# Altium footprint library Footprints.PcbLib: 29 footprints (part 2 of 2)
Each footprint in its own frame and in the unit in brackets; x right, y up, seen from the top. Pads: shape width x height; smd on the part's side, far side on the other; paste and mask are expansions set on the pad; w line width, h text height; cw(c..) or ccw(c..) is an arc to the next point about the centre after c.
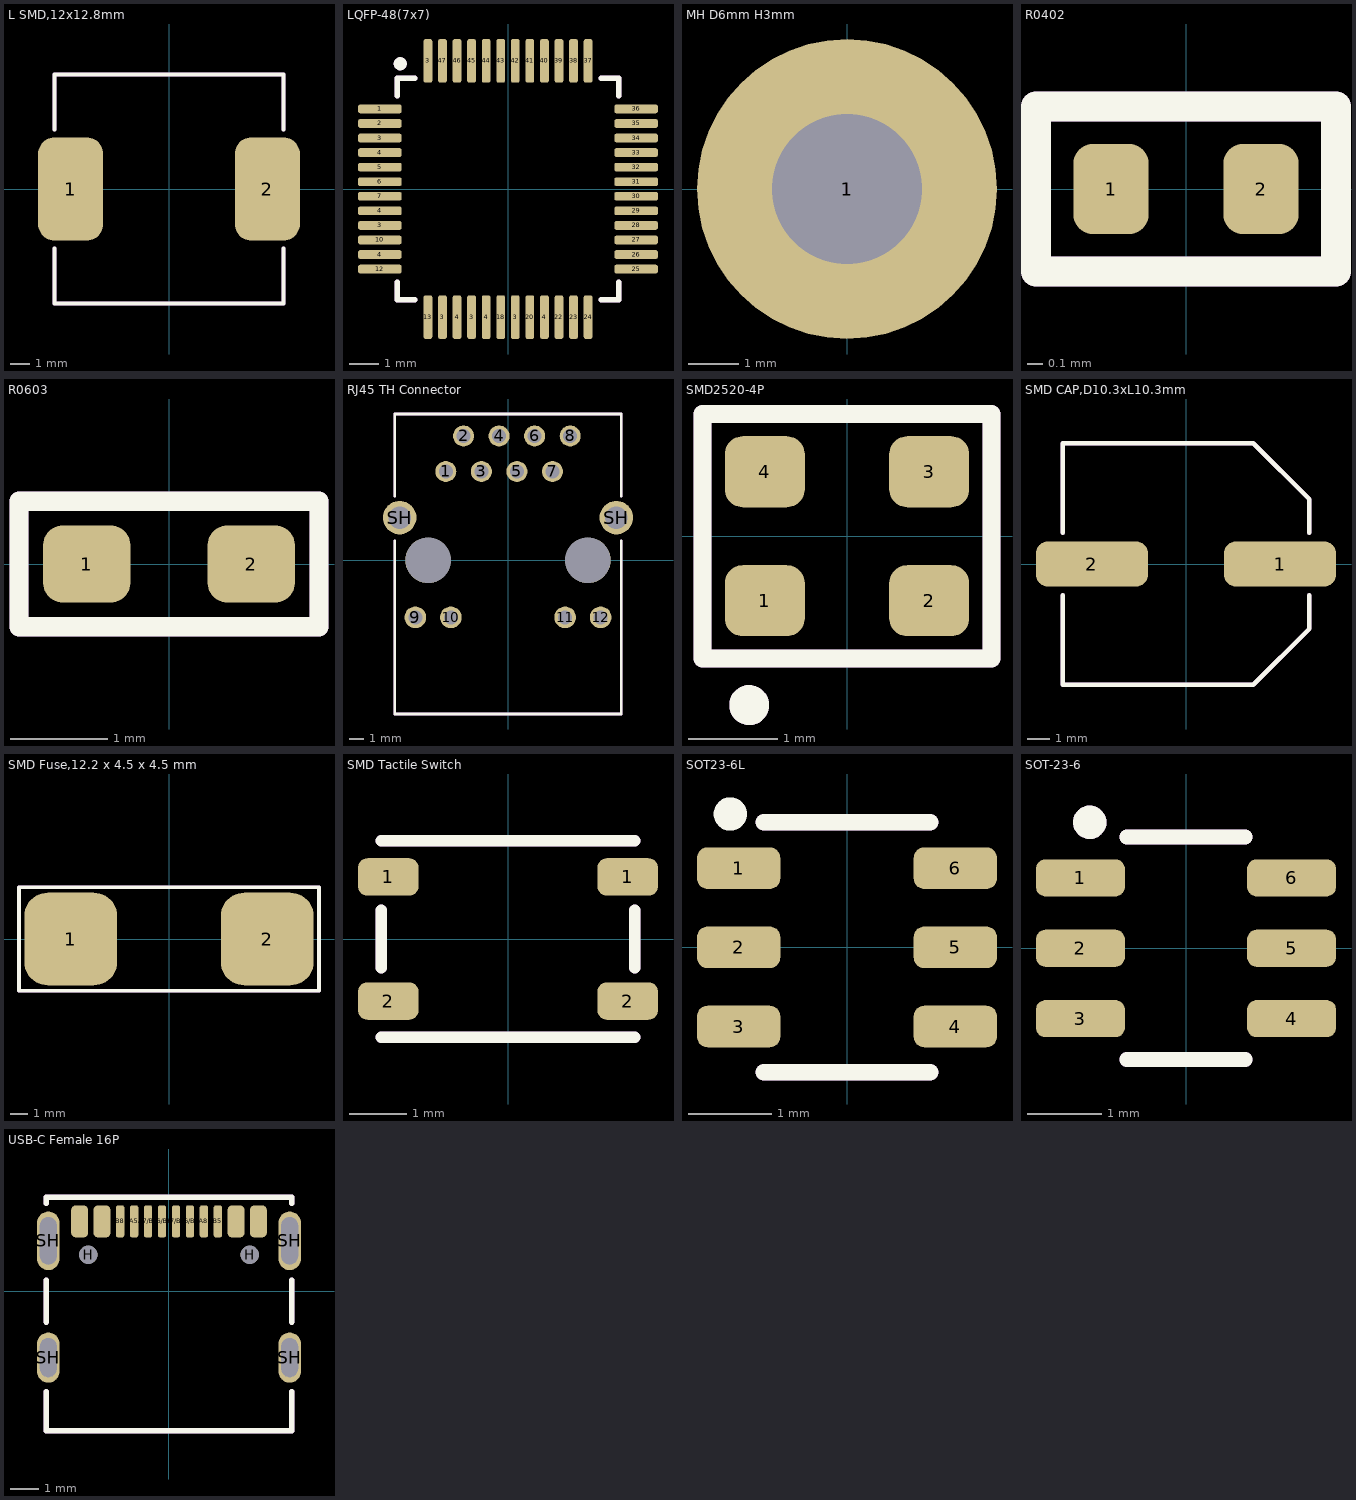
[diagram p1: the footprints below, top view; thin cyan lines are the x and y axes]

## L SMD,12x12.8mm [mm]
pads (2):
  rrect50% 3.4x5.4 smd: 1(-5.15,0) 2(5.15,0)
Top Overlay:
  lines w0.2: -6,-3.1 -6,-6 6,-6 6,-3.1 ; -6,3.1 -6,6 6,6 6,3.1
Top Assembly:
  lines w0.2: -6,-3.1 -6,-6 6,-6 6,-3.1 ; -6,3.1 -6,6 6,6 6,3.1
  text ".Designator" at -4.998,-0.333 h1
3D body "L SMD,12x12.8mm.stp": height 9.47, standoff 0.01, extent -6,-6 6,6

## LQFP-48(7x7) [mm]
pads (48):
  rrect50% 1.5x0.3 smd: 1(-4.4,2.75) 2(-4.4,2.25) 3(-4.4,-1.25) 3(-4.4,1.75) 4(-4.4,-2.25) 4(-4.4,-0.75) 4(-4.4,1.25) 5(-4.4,0.75) 6(-4.4,0.25) 7(-4.4,-0.25) 10(-4.4,-1.75) 12(-4.4,-2.75) 25(4.4,-2.75) 26(4.4,-2.25) 27(4.4,-1.75) 28(4.4,-1.25) 29(4.4,-0.75) 30(4.4,-0.25) 31(4.4,0.25) 32(4.4,0.75) 33(4.4,1.25) 34(4.4,1.75) 35(4.4,2.25) 36(4.4,2.75)
  rrect50% 0.3x1.5 smd: 3(-2.75,4.4) 3(-2.25,-4.4) 3(-1.25,-4.4) 3(0.25,-4.4) 4(-1.75,-4.4) 4(-0.75,-4.4) 4(1.25,-4.4) 13(-2.75,-4.4) 18(-0.25,-4.4) 20(0.75,-4.4) 22(1.75,-4.4) 23(2.25,-4.4) 24(2.75,-4.4) 37(2.75,4.4) 38(2.25,4.4) 39(1.75,4.4) 40(1.25,4.4) 41(0.75,4.4) 42(0.25,4.4) 43(-0.25,4.4) 44(-0.75,4.4) 45(-1.25,4.4) 46(-1.75,4.4) 47(-2.25,4.4)
Top Overlay:
  circle w0.25: c-3.7,4.3 r0.1
  lines w0.2: -3.8,-3.2 -3.8,-3.8 -3.2,-3.8 ; -3.8,3.2 -3.8,3.8 -3.2,3.8 ; 3.2,-3.8 3.8,-3.8 3.8,-3.2 ; 3.2,3.8 3.8,3.8 3.8,3.2
Top Assembly:
  circle w0.25: c-3.7,4.3 r0.1
  lines w0.2: -3.8,-3.2 -3.8,-3.8 -3.2,-3.8 ; -3.8,3.2 -3.8,3.8 -3.2,3.8 ; 3.2,-3.8 3.8,-3.8 3.8,-3.2 ; 3.2,3.8 3.8,3.8 3.8,3.2
  text ".Designator" at -4.998,-0.333 h1
3D body "LQFP-48(7x7).step": height 1.6, standoff 0, extent -4.597,-4.597 4.597,4.597

## MH D6mm H3mm [mm]
pads (1):
  round 6 hole 3: 1(0,0)

## R0402 [mm]
pads (2):
  rrect50% 0.5x0.6 smd: 1(-0.5,0) 2(0.5,0)
Top Overlay:
  lines w0.2: -1,-0.55 -1,0.55 1,0.55 1,-0.55 -1,-0.55
Top Assembly:
  lines w0.2: -1,-0.55 -1,0.55 1,0.55 1,-0.55 -1,-0.55
  text ".Designator" at -3.999,-0.267 h0.8
3D body "R0402.step": height 0.4, standoff 0, extent -0.5,-0.25 0.5,0.25

## R0603 [mm]
pads (2):
  rrect50% 0.9x0.8 smd: 1(-0.85,0) 2(0.85,0)
Top Overlay:
  lines w0.2: -1.55,-0.65 -1.55,0.65 1.55,0.65 1.55,-0.65 -1.55,-0.65
Top Assembly:
  lines w0.2: -1.55,-0.65 -1.55,0.65 1.55,0.65 1.55,-0.65 -1.55,-0.65
  text ".Designator" at -2.999,-0.2 h0.6
3D body "R0603.step": height 0.55, standoff 0, extent -0.8,-0.4 0.8,0.4

## RJ45 TH Connector [mm]
pads (16):
  round 1.5 hole 1: 1(-4.445,6.35) 2(-3.175,8.89) 3(-1.905,6.35) 4(-0.635,8.89) 5(0.635,6.35) 6(1.905,8.89) 7(3.175,6.35) 8(4.445,8.89)
  round 1.55 hole 1: 9(-6.625,-4.08) 10(-4.085,-4.08) 11(4.085,-4.08) 12(6.625,-4.08)
  round 2.4 hole 1.6: SH(-7.745,3.05) SH(7.745,3.05)
  round 3.25 hole 3.25 unplated: ""(-5.715,0) ""(5.715,0)
Top Overlay:
  lines w0.2: -8.1,1.4 -8.1,-10.99 8.1,-10.99 8.1,1.4 ; -8.1,4.6 -8.1,10.46 8.1,10.46 8.1,4.6
Top Assembly:
  lines w0.2: -8.1,1.4 -8.1,-10.99 8.1,-10.99 8.1,1.4 ; -8.1,4.6 -8.1,10.46 8.1,10.46 8.1,4.6
  text ".Designator" at -4.998,-0.333 h1
3D body "step_temp.STEP": height 15.05, standoff -3.4, extent -9.348,-10.715 9.348,10.535

## SMD2520-4P [mm]
pads (4):
  rrect50% 0.9x0.8 smd: 1(-0.925,-0.725) 2(0.925,-0.725) 3(0.925,0.725) 4(-0.925,0.725)
Top Overlay:
  circle w0.25: c-1.1,-1.9 r0.1
  lines w0.2: -1.625,-1.375 1.625,-1.375 1.625,1.375 -1.625,1.375 -1.625,-1.375
Top Assembly:
  circle w0.25: c-1.1,-1.9 r0.1
  lines w0.2: -1.625,-1.375 1.625,-1.375 1.625,1.375 -1.625,1.375 -1.625,-1.375
  text ".Designator" at -2.999,-0.2 h0.6
3D body "SMD2520-4P.STEP": height 0.9, standoff 0, extent -1.25,-1 1.25,1

## SMD CAP,D10.3xL10.3mm [mm]
pads (2):
  rrect50% 5x2 smd: 1(4.2,0) 2(-4.2,0)
Top Overlay:
  lines w0.2: -5.5,-1.4 -5.5,-5.4 3,-5.4 5.5,-2.9 5.5,-1.4 ; -5.5,1.4 -5.5,5.4 3,5.4 5.5,2.9 5.5,1.4
Top Assembly:
  lines w0.2: -5.5,-1.4 -5.5,-5.4 3,-5.4 5.5,-2.9 5.5,-1.4 ; -5.5,1.4 -5.5,5.4 3,5.4 5.5,2.9 5.5,1.4
  text ".Designator" at -4.998,-0.333 h1
3D body "EEHZA1K330P.STEP": height 10.2, standoff 0, extent -5.85,-5.15 5.85,5.15

## SMD Fuse,12.2 x 4.5 x 4.5 mm [mm]
pads (2):
  rrect50% 5.2x5.2 smd: 1(-5.5,0) 2(5.5,0)
Top Overlay:
  lines w0.2: -8.4,-2.9 -8.4,2.9 8.4,2.9 8.4,-2.9 -8.4,-2.9
Top Assembly:
  lines w0.2: -8.4,-2.9 -8.4,2.9 8.4,2.9 8.4,-2.9 -8.4,-2.9
  text ".Designator" at -4.998,-0.333 h1
3D body "FUS_LITTELFUSE_0456_40A_LTF.step": height 4.39, standoff -0.05, extent -6.248,-2.222 6.248,2.222

## SMD Tactile Switch [mm]
pads (4):
  rrect50% 1.05x0.65 smd: 1(-2.075,1.075) 1(2.075,1.075) 2(-2.075,-1.075) 2(2.075,-1.075)
Top Overlay:
  lines w0.2: -2.2,-1.7 2.2,-1.7 ; -2.2,-0.5 -2.2,0.5 ; -2.2,1.7 2.2,1.7 ; 2.2,-0.5 2.2,0.5
Top Assembly:
  lines w0.2: -2.2,-1.7 2.2,-1.7 ; -2.2,-0.5 -2.2,0.5 ; -2.2,1.7 2.2,1.7 ; 2.2,-0.5 2.2,0.5
  text ".Designator" at -2.999,-0.2 h0.6
3D body "SMD Tactile Switch.STEP": height 2.51, standoff 0, extent -2.247,-1.6 2.251,1.6

## SOT23-6L [mm]
pads (6):
  rrect50% 1x0.5 smd: 1(-1.3,0.95) 2(-1.3,0) 3(-1.3,-0.95) 4(1.3,-0.95) 5(1.3,0) 6(1.3,0.95)
Top Overlay:
  circle w0.2: c-1.4,1.6 r0.1
  lines w0.2: -1,-1.5 1,-1.5 ; -1,1.5 1,1.5
Top Assembly:
  circle w0.15: c-1.4,1.6 r0.075
  lines w0.2: -1,-1.5 1,-1.5 ; -1,1.5 1,1.5
  text ".Designator" at -3.999,-0.267 h0.8
3D body "SOT23-6L.step": height 1.45, standoff 0, extent -1.4,-1.462 1.4,1.462

## SOT-23-6 [mm]
pads (6):
  rrect50% 1.2x0.5 smd: 1(-1.425,0.95) 2(-1.425,0) 3(-1.425,-0.95) 4(1.425,-0.95) 5(1.425,0) 6(1.425,0.95)
Top Overlay:
  circle w0.25: c-1.3,1.7 r0.1
  lines w0.2: -0.8,-1.5 0.8,-1.5 ; -0.8,1.5 0.8,1.5
Top Assembly:
  circle w0.25: c-1.3,1.7 r0.1
  lines w0.2: -0.8,-1.5 0.8,-1.5 ; -0.8,1.5 0.8,1.5
  text ".Designator" at -4.998,-0.333 h1
3D body "SOT-23-6.step": height 0.95, standoff 0, extent -1.435,-1.45 1.435,1.45

## USB-C Female 16P [mm]
pads (18):
  rrect50% 0.6x1.14 smd: A1B12/B1A12(-3.2,2.5) A1B12/B1A12(3.2,2.5) "A4B9/ B4A9"(-2.4,2.5) "A4B9/ B4A9"(2.4,2.5)
  rrect50% 0.3x1.14 smd: A5(-1.25,2.5) A6/B6(-0.25,2.5) A6/B6(0.75,2.5) A7/B7(-0.75,2.5) A7/B7(0.25,2.5) A8(1.25,2.5) B5(1.75,2.5) B8(-1.75,2.5)
  round 0.65 hole 0.65 unplated mask+0: H(-2.89,1.305) H(2.89,1.305)
  oval 0.8x1.8 hole 0.6 slot 1.4 at 90 deg: SH(-4.32,-2.375) SH(4.32,-2.375)
  oval 0.8x2.1 hole 0.6 slot 1.7 at 90 deg: SH(-4.32,1.805) SH(4.32,1.805)
Top Overlay:
  lines w0.2: -4.4,-3.6 -4.4,-5 4.4,-5 4.4,-3.6 ; -4.4,-1.1 -4.4,0.4 ; -4.4,3.15 -4.4,3.35 ; -4.4,3.37 4.4,3.37 ; 4.4,-1.1 4.4,0.4 ; 4.4,3.15 4.4,3.35
Top Assembly:
  lines w0.2: -4.4,-3.6 -4.4,-5 4.4,-5 4.4,-3.6 ; -4.4,-1.1 -4.4,0.4 ; -4.4,3.15 -4.4,3.35 ; -4.4,3.37 4.4,3.37 ; 4.4,-1.1 4.4,0.4 ; 4.4,3.15 4.4,3.35
  text ".Designator" at -4.998,-0.333 h1
3D body "USB2.0 16P Female Connector.STEP": height 3.31, standoff -1.2, extent -4.47,-5 4.47,2.71